# Altium footprint library EMDC_Packages.PcbLib: 274 footprints (part 3 of 18)
Each footprint in its own frame and in the unit in brackets; x right, y up, seen from the top. Pads: shape width x height; smd on the part's side, far side on the other; paste and mask are expansions set on the pad; w line width, h text height; cw(c..) or ccw(c..) is an arc to the next point about the centre after c.
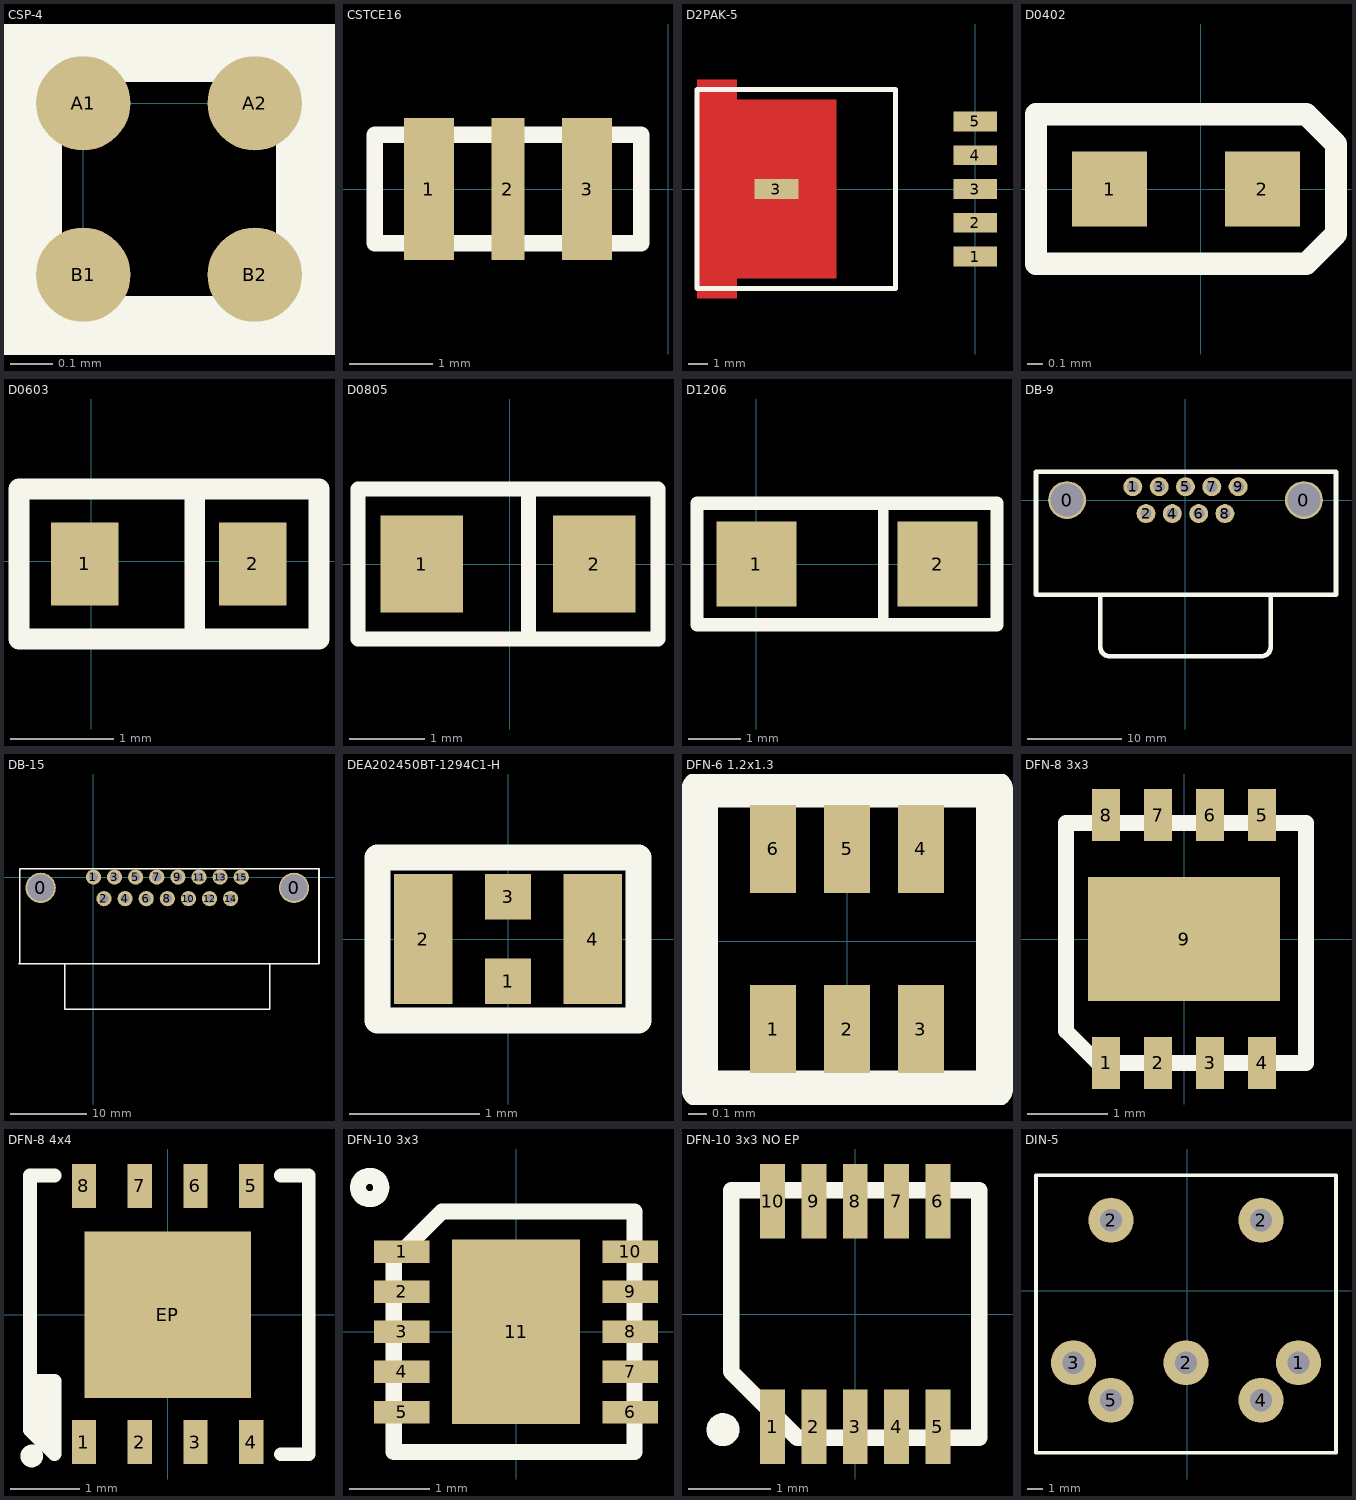
[diagram p2: the footprints below, top view; thin cyan lines are the x and y axes]

## CSP-4 [mm]
pads (4):
  round 0.22 smd paste+0: A1(0,0) A2(0.4,0) B1(0,-0.4) B2(0.4,-0.4)
Top Overlay:
  lines w0.2: -0.15,-0.55 -0.15,0.15 0.55,0.15 0.55,-0.55 -0.15,-0.55
3D body: height 0.4, standoff 0, extent -0.15,-0.55 0.55,0.15

## CSTCE16 [mm]
pads (3):
  rect 0.6x1.7 smd: 1(-2.875,0) 3(-0.975,0)
  rect 0.4x1.7 smd: 2(-1.925,0)
Top Overlay:
  lines w0.2: -3.525,-0.65 -0.325,-0.65 -0.325,0.65 -3.525,0.65 -3.525,-0.65
3D body "SW3dPS-CSTCE_V-1.STEP": height 1.02, standoff -0.09, extent -3.525,-0.65 -0.325,0.65

## D2PAK-5 [mm]
pads (6):
  rect 2.2x1 smd: 1(0,-3.4) 2(0,-1.7) 3(-10,0) 3(0,0) 4(0,1.7) 5(0,3.4)
Top Layer:
  region: -14,5.5 -14,-5.5 -12,-5.5 -12,-4.5 -7,-4.5 -7,4.5 -12,4.5 -12,5.5
Top Overlay:
  lines w0.254: -14,-5 -4,-5 -4,5 -14,5 -14,-5

## D0402 [mm]
pads (2):
  rect 0.5x0.5 smd: 1(-0.61,0) 2(0.41,0)
Top Overlay:
  lines w0.15: -1.1,-0.5 -1.1,0.5 0.7,0.5 0.9,0.3 0.9,-0.3 0.7,-0.5 -1.1,-0.5
3D body "User Library-CDBQ0230L.step": height 0.56, standoff 0, extent -0.646,-0.33 0.446,0.33

## D0603 [mm]
pads (2):
  rect 0.65x0.8 smd: 1(-0.065,-0.025) 2(1.56,-0.025)
Top Overlay:
  lines w0.2: 1,-0.725 1,0.7 ; -0.7,-0.75 -0.7,0.7 2.2,0.7 2.2,-0.75 -0.7,-0.75
3D body "User Library-D0603.step": height 0.56, standoff 0, extent -0.125,-0.425 1.575,0.375

## D0805 [mm]
pads (2):
  rect 1.1x1.3 smd: 1(-1.175,0) 2(1.125,0)
Top Overlay:
  lines w0.2: 0.25,-1 0.25,1 ; -2.025,-1 1.975,-1 1.975,1 -2.025,1 -2.025,-1
3D body "User Library-led_0805LED0805_red.STEP": height 1.1, standoff 0, extent -1.01,-0.625 1.01,0.625

## D1206 [mm]
pads (2):
  rect 1.52x1.6 smd: 1(0,0) 2(3.425,0)
Top Overlay:
  lines w0.2: 2.4,-1.125 2.4,1.15
  lines w0.254: -1.125,-1.15 4.55,-1.15 4.55,1.15 -1.125,1.15 -1.125,-1.15
3D body "User Library-RES_3216-1206.STEP": height 0.85, standoff 0, extent 0.025,-0.865 3.375,0.865

## DB-9 [mm]
pads (11):
  round 4 hole 3.5: 0(-12.51,0) 0(12.51,0)
  round 2 hole 1.2: 1(-5.56,1.42) 2(-4.17,-1.42) 3(-2.78,1.42) 4(-1.39,-1.42) 5(0,1.42) 6(1.39,-1.42) 7(2.78,1.42) 8(4.17,-1.42) 9(5.56,1.42)
Top Overlay:
  lines w0.508: -9,-10 -9,-15.5 ccw(c-8,-15.5) -8,-16.5 8,-16.5 ccw(c8,-15.5) 9,-15.5 9,-10 ; 15.89,3 15.89,-10 -15.79,-10 -15.79,3 15.9,3
3D body "SW3dPS-Connector DB-9-m PCB.STEP": height 12.42, standoff 0, extent -15.5,-16.536 15.6,2.75

## DB-15 [mm]
pads (17):
  round 4 hole 3.5: 0(-6.95,-1.42) 0(26.41,-1.42)
  round 2 hole 1.2: 1(0,0) 2(1.39,-2.84) 3(2.78,0) 4(4.17,-2.84) 5(5.56,0) 6(6.95,-2.84) 7(8.34,0) 8(9.73,-2.84) 9(11.12,0) 10(12.51,-2.84) 11(13.9,0) 12(15.29,-2.84) 13(16.68,0) 14(18.07,-2.84) 15(19.46,0)
Top Overlay:
  lines w0.2: -9.8,-11.4 29.7,-11.4 29.7,1.1 -9.7,1.1 -9.7,-11.4 ; -3.8,-11.4 -3.8,-17.4 23.2,-17.4 23.2,-11.4
3D body "SW3dPS-DB-15-f.STEP": height 12.42, standoff 0, extent -9.72,-17.94 29.7,1.05

## DEA202450BT-1294C1-H [mm] "2.4GHz filter"
pads (4):
  rect 0.35x0.35 smd: 1(0,-0.325) 3(0,0.325)
  rect 0.45x1 smd: 2(-0.65,0) 4(0.65,0)
Top Overlay:
  lines w0.2: -1,-0.625 -1,0.625 1,0.625 1,-0.625 -1,-0.625

## DFN-6 1.2x1.3 [mm]
pads (6):
  rect 0.25x0.475 smd paste+0 mask+0: 1(-0.4,-0.475) 2(0,-0.475) 3(0.4,-0.475) 4(0.4,0.5) 5(0,0.5) 6(-0.4,0.5)
Top Overlay:
  lines w0.2: -0.8,-0.8 0.8,-0.8 0.8,0.825 -0.8,0.825 -0.8,-0.8
3D body: height 0.38, standoff 0, extent -0.65,-0.6 0.65,0.6

## DFN-8 3x3 [mm]
pads (9):
  rect 0.35x0.65 smd paste+0: 1(-0.975,-1.55) 2(-0.325,-1.55) 3(0.325,-1.55) 4(0.975,-1.55) 5(0.975,1.55) 6(0.325,1.55) 7(-0.325,1.55) 8(-0.975,1.55)
  rect 2.4x1.55 smd paste+0: 9(0,0)
Top Overlay:
  lines w0.2: -1.475,-1.15 -1.075,-1.55 1.525,-1.55 1.525,1.45 -1.475,1.45 -1.475,-1.15
3D body "User Library-DFN8_3x3mm__65mm.STEP": height 0.8, standoff 0, extent -1.475,-1.57 1.525,1.45

## DFN-8 4x4 [mm]
pads (9):
  rect 0.35x0.63 smd: 1(-1.2,-1.825) 2(-0.4,-1.825) 3(0.4,-1.825) 4(1.2,-1.825) 5(1.2,1.85) 6(0.4,1.85) 7(-0.4,1.85) 8(-1.2,1.85)
  rect 2.39x2.39 smd: EP(0,0)
Top Overlay:
  circle w0.254: c-1.95,-2.025 r0.035
  region: -1.625,-2 -1.625,-0.95 -1.975,-0.95 -1.975,-1.65
  lines w0.2: -1.975,-0.95 -1.625,-0.95 -1.625,-2 ; -1.625,2 -1.975,2 -1.975,-1.65 -1.625,-2 ; 1.625,2 2.025,2 2.025,-2 1.625,-2 ; -1.625,-2 -1.625,-2 ; 1.625,-2 1.625,-2
3D body "User Library-DFN8 Body 4x4 Pitch 0_8mm.STEP": height 0.95, standoff -0.05, extent -2,-1.975 2,2.125

## DFN-10 3x3 [mm]
pads (11):
  rect 0.69x0.28 smd: 1(-1.425,1) 2(-1.425,0.5) 3(-1.425,0) 4(-1.425,-0.5) 5(-1.425,-1) 6(1.425,-1) 7(1.425,-0.5) 8(1.425,0) 9(1.425,0.5) 10(1.425,1)
  rect 1.6x2.3 smd: 11(0,0)
Top Overlay:
  circle w0.2: c-1.825,1.8 r0.146
  lines w0.2: -1.525,-1.5 1.475,-1.5 1.475,1.5 -0.925,1.5 -1.525,0.9 -1.525,-1.5
3D body "User Library-DFN-10.STEP": height 0.8, standoff 0, extent -1.525,-1.5 1.475,1.5

## DFN-10 3x3 NO EP [mm]
pads (10):
  rect 0.3x0.9 smd: 1(-1,-1.365) 2(-0.5,-1.365) 3(0,-1.365) 4(0.5,-1.365) 5(1,-1.365) 6(1,1.365) 7(0.5,1.365) 8(0,1.365) 9(-0.5,1.365) 10(-1,1.365)
Top Overlay:
  circle w0.2: c-1.6,-1.4 r0.1
  lines w0.2: -1.5,-0.7 -0.7,-1.5 1.5,-1.5 1.5,1.5 -1.5,1.5 -1.5,-0.7
3D body "User Library-DFN-10.STEP": height 0.8, standoff 0, extent -1.5,-1.5 1.5,1.5

## DIN-5 [mm]
pads (7):
  round 3 hole 1.5: 1(7.4,-4.8) 2(-5.1,4.7) 2(-0.1,-4.8) 2(4.9,4.7) 3(-7.6,-4.8) 4(4.9,-7.3) 5(-5.1,-7.3)
Top Overlay:
  lines w0.254: -10.1,-10.8 -10.1,7.7 9.9,7.7 9.9,-10.8 -10.1,-10.8
3D body "DIN-5_1.step": height 21.1, standoff -3.5, extent -10.05,-10.8 9.95,7.7